# Altium footprint library 未分类IC.PcbLib: 28 footprints (part 1 of 2)
Each footprint in its own frame and in the unit in brackets; x right, y up, seen from the top. Pads: shape width x height; smd on the part's side, far side on the other; paste and mask are expansions set on the pad; w line width, h text height; cw(c..) or ccw(c..) is an arc to the next point about the centre after c.
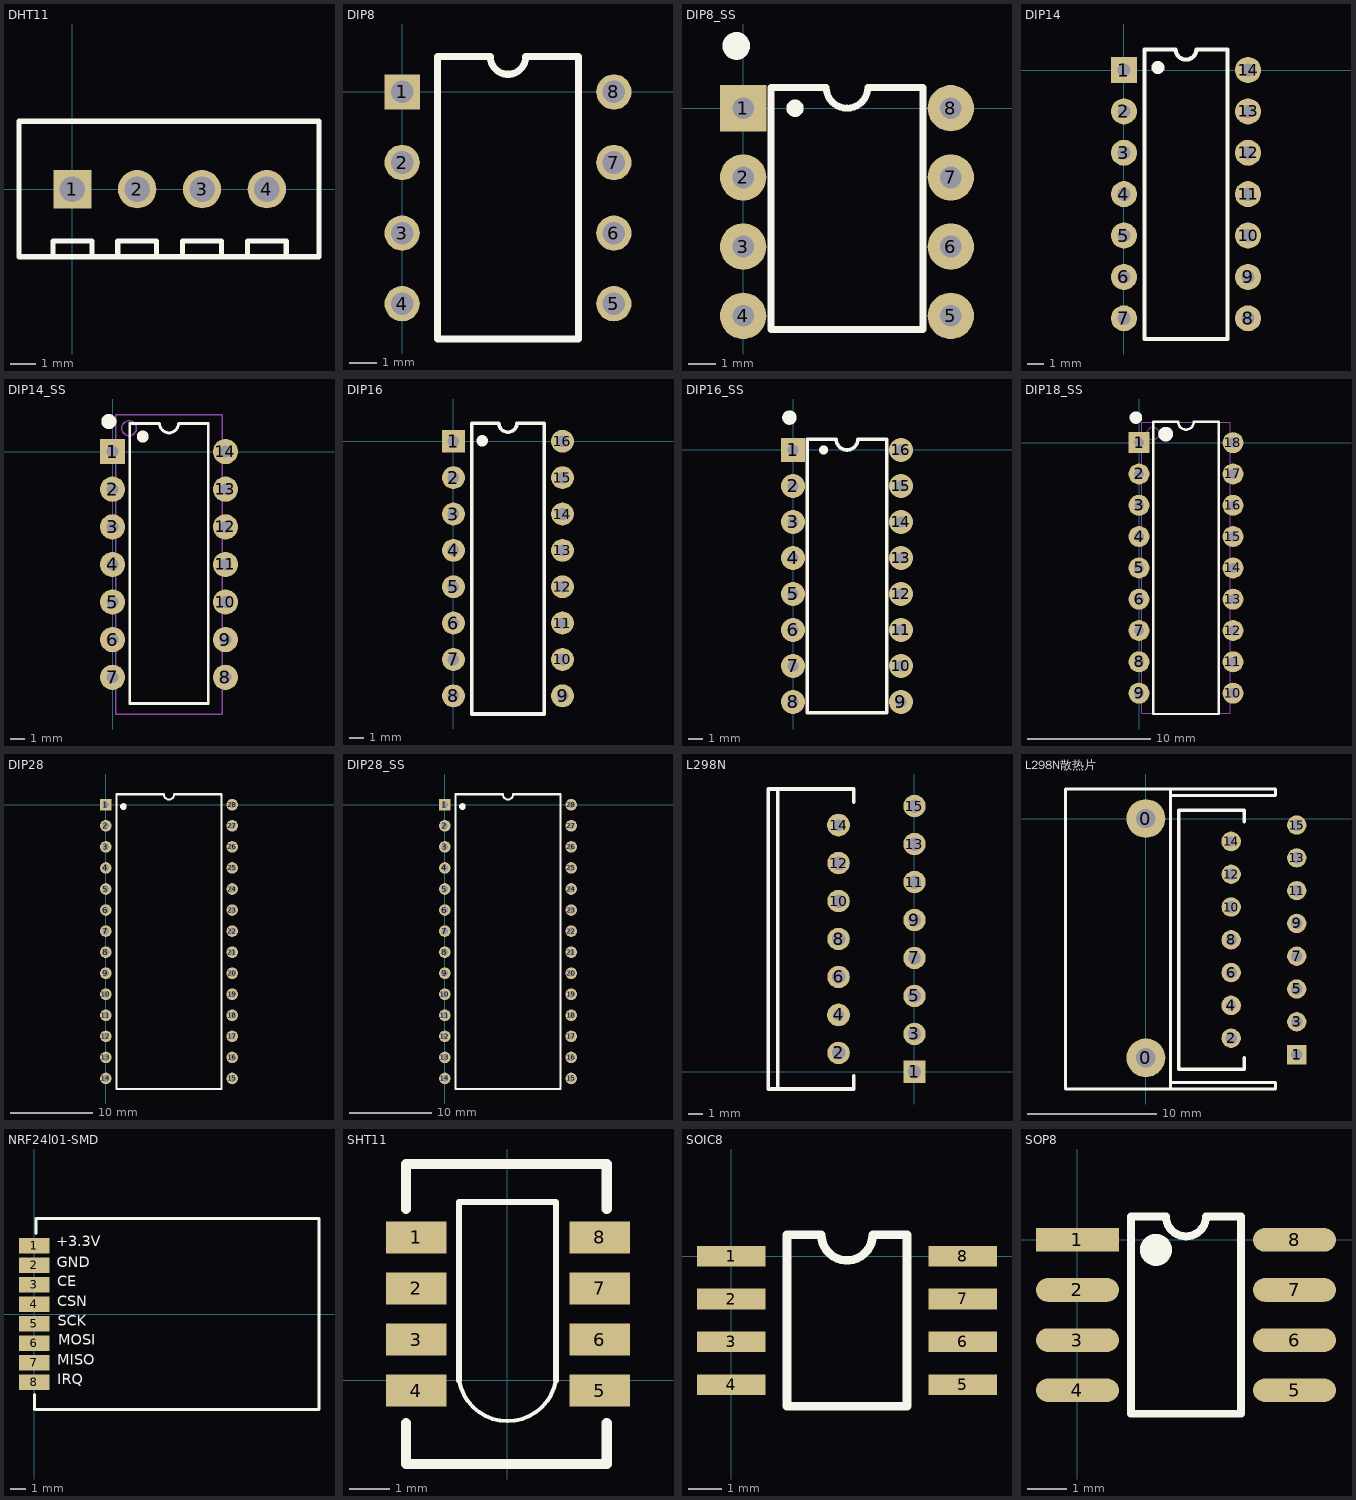
[diagram p0: the footprints below, top view; thin cyan lines are the x and y axes]

## DHT11 [mm]
pads (4):
  rect 1.5x1.5 hole 1: 1(0,0)
  round 1.5 hole 1: 2(2.54,0) 3(5.08,0) 4(7.62,0)
Top Overlay:
  lines w0.203: -0.762,-2.648 -0.762,-2.032 0.762,-2.032 0.762,-2.648 ; 1.778,-2.648 1.778,-2.032 3.302,-2.032 3.302,-2.54 ; 4.318,-2.648 4.318,-2.032 5.842,-2.032 5.842,-2.54 ; 6.858,-2.648 6.858,-2.032 8.382,-2.032 8.382,-2.54 ; -2.094,-2.648 9.666,-2.648 9.666,2.66 -2.094,2.66 -2.094,-2.648
3D body "User Library-DHT11.STEP": height 15.5, standoff -8, extent -2.221,-2.75 9.779,2.75

## DIP8 [mil]
pads (8):
  rect 50x50 hole 32: 1(0,0)
  round 50 hole 32: 2(0,-100) 3(0,-200) 4(0,-300) 5(300,-300) 6(300,-200) 7(300,-100) 8(300,0)
Top Overlay:
  lines w10: 50,-350 50,50 125,50 ccw(c150,50) 175,50 250,50 250,-350 50,-350
3D body "DIP8.STEP": height 200, standoff -137.8, extent -4.92,-359.96 304.92,69.96

## DIP8_SS [mm] "DIP8-SMD Socket"
pads (8):
  rect 1.7x1.7 hole 0.8: 1(0,0)
  round 1.7 hole 0.8: 2(0,-2.54) 3(0,-5.08) 4(0,-7.62) 5(7.62,-7.62) 6(7.62,-5.08) 7(7.62,-2.54) 8(7.62,0)
Top Overlay:
  circle w0.508: c-0.254,2.286 r0.254
  circle w0.381: c1.905,0 r0.127
  lines w0.254: 1.016,-8.128 6.604,-8.128 6.604,0.762 4.572,0.762 cw(c3.81,0.762) 3.81,0 cw(c3.81,0.762) 3.048,0.762 1.016,0.762 1.016,-8.128
3D body "DIP-MH8-300.STEP": height 4.95, standoff -2.95, extent -1.19,-9 8.81,1.38
3D body "DIP8-300.STEP": height 7.7, standoff 0, extent -0.115,-8.51 7.735,0.89

## DIP14 [mm]
pads (14):
  rect 1.6x1.6 hole 0.813: 1(0,0)
  round 1.6 hole 0.813: 2(0,-2.54) 3(0,-5.08) 4(0,-7.62) 5(0,-10.16) 6(0,-12.7) 7(0,-15.24) 8(7.62,-15.24) 9(7.62,-12.7) 10(7.62,-10.16) 11(7.62,-7.62) 12(7.62,-5.08) 13(7.62,-2.54) 14(7.62,0)
Top Overlay:
  circle w0.5: c2.085,0.155 r0.15
  lines w0.254: 1.27,-16.51 6.35,-16.51 6.35,1.27 4.445,1.27 cw(c3.81,1.27) 3.175,1.27 1.27,1.27 1.27,-16.51
3D body "DIP14.STEP": height 5.1, standoff -3.3, extent -0.25,-17.62 7.62,2.38

## DIP14_SS [mm] "DIP14-SMD Socket"
pads (14):
  rect 1.7x1.7 hole 0.8: 1(0,0)
  round 1.7 hole 0.8: 2(0,-2.54) 3(0,-5.08) 4(0,-7.62) 5(0,-10.16) 6(0,-12.7) 7(0,-15.24) 8(7.62,-15.24) 9(7.62,-12.7) 10(7.62,-10.16) 11(7.62,-7.62) 12(7.62,-5.08) 13(7.62,-2.54) 14(7.62,0)
Top Overlay:
  circle w0.6: c2.032,1.016 r0.1
  circle w0.508: c-0.254,2.032 r0.254
  lines w0.2: 1.16,-17.018 1.16,1.905 3.175,1.905 ccw(c3.81,1.905) 4.445,1.905 6.46,1.905 6.46,-17.018 1.16,-17.018
Mechanical 13:
  circle w0.1: c1.11,1.58 r0.5
  lines w0.1: 0.21,-17.72 0.21,2.48 7.41,2.48 7.41,-17.72 0.21,-17.72
3D body "DIP14-300.STEP": height 7.15, standoff -0.3, extent -0.17,-17.12 7.79,1.88
3D body "DIP-MH14-300.STEP": height 4.95, standoff -2.95, extent -1.19,-16.62 8.81,1.38

## DIP16 [mm]
pads (16):
  rect 1.6x1.6 hole 0.813: 1(0,0)
  round 1.6 hole 0.813: 2(0,-2.54) 3(0,-5.08) 4(0,-7.62) 5(0,-10.16) 6(0,-12.7) 7(0,-15.24) 8(0,-17.78) 9(7.627,-17.78) 10(7.62,-15.24) 11(7.62,-12.7) 12(7.62,-10.16) 13(7.62,-7.62) 14(7.62,-5.08) 15(7.62,-2.54) 16(7.62,0)
Top Overlay:
  circle w0.5: c2.014,0.035 r0.15
  lines w0.254: 1.27,-19.05 6.35,-19.05 6.35,1.27 4.445,1.27 cw(c3.81,1.27) 3.175,1.27 1.27,1.27 1.27,-19.05
3D body "DIP16.STEP": height 5.1, standoff -3.3, extent -0.119,-18.763 7.751,1.237

## DIP16_SS [mm] "DIP16-SMD Socket"
pads (16):
  rect 1.7x1.7 hole 0.8: 1(0,0)
  round 1.7 hole 0.8: 2(0,-2.54) 3(0,-5.08) 4(0,-7.62) 5(0,-10.16) 6(0,-12.7) 7(0,-15.24) 8(0,-17.78) 9(7.62,-17.78) 10(7.62,-15.24) 11(7.62,-12.7) 12(7.62,-10.16) 13(7.62,-7.62) 14(7.62,-5.08) 15(7.62,-2.54) 16(7.62,0)
Top Overlay:
  circle w0.381: c2.159,0 r0.127
  circle w0.508: c-0.254,2.286 r0.254
  lines w0.254: 1.016,-18.542 1.016,0.762 3.048,0.762 ccw(c3.81,0.762) 3.81,0 ccw(c3.81,0.762) 4.572,0.762 6.604,0.762 6.604,-18.542 1.016,-18.542
3D body "DIP-MH16-300.STEP": height 5.25, standoff -2.95, extent -1.171,-19.14 8.81,1.36
3D body "DIP16-300.STEP": height 7.5, standoff -0.1, extent -0.21,-18.54 7.83,0.76

## DIP18_SS [mm] "DIP18-SMD Socket"
height 5.08
pads (18):
  rect 1.7x1.7 hole 0.8: 1(0,0)
  round 1.7 hole 0.8: 2(0,-2.54) 3(0,-5.08) 4(0,-7.62) 5(0,-10.16) 6(0,-12.7) 7(0,-15.24) 8(0,-17.78) 9(0,-20.32) 10(7.62,-20.32) 11(7.62,-17.78) 12(7.62,-15.24) 13(7.62,-12.7) 14(7.62,-10.16) 15(7.62,-7.62) 16(7.62,-5.08) 17(7.62,-2.54) 18(7.62,0)
Top Overlay:
  circle w0.508: c-0.254,2.032 r0.254
  circle w0.6: c2.16,0.69 r0.3
  lines w0.2: 1.16,-22.01 1.16,1.69 3.175,1.69 ccw(c3.81,1.69) 4.445,1.69 6.46,1.69 6.46,-22.01 1.16,-22.01
Mechanical 13:
  circle w0.1: c1.11,0.74 r0.5
  lines w0.1: 0.21,-21.96 0.21,1.64 7.41,1.64 7.41,-21.96 0.21,-21.96
3D body "DIP18-300.STEP": height 7.4, standoff -0.04, extent -0.19,-21.71 7.81,1.39
3D body "DIP-MH18-300.STEP": height 5.25, standoff -2.95, extent -1.171,-21.68 8.81,1.36

## DIP28 [mm]
pads (28):
  rect 1.4x1.4 hole 0.813: 1(0,0)
  round 1.4 hole 0.813: 2(0,-2.54) 3(0,-5.08) 4(0,-7.62) 5(0,-10.16) 6(0,-12.7) 7(0,-15.24) 8(0,-17.78) 9(0,-20.32) 10(0,-22.86) 11(0,-25.4) 12(0,-27.94) 13(0,-30.48) 14(0,-33.02) 15(15.24,-33.02) 16(15.24,-30.48) 17(15.24,-27.94) 18(15.24,-25.4) 19(15.24,-22.86) 20(15.24,-20.32) 21(15.24,-17.78) 22(15.24,-15.24) 23(15.24,-12.7) 24(15.24,-10.16) 25(15.24,-7.62) 26(15.24,-5.08) 27(15.24,-2.54) 28(15.24,0)
Top Overlay:
  circle w0.5: c2.12,-0.21 r0.15
  lines w0.254: 1.27,-34.29 13.97,-34.29 13.97,1.27 8.255,1.27 cw(c7.62,1.27) 6.985,1.27 1.27,1.27 1.27,-34.29
3D body "DIP28.STEP": height 4.66, standoff -3.28, extent -0.126,-34.486 15.494,1.524

## DIP28_SS [mm] "DIP28-SMD Socket"
pads (28):
  rect 1.4x1.4 hole 0.813: 1(0,0)
  round 1.4 hole 0.813: 2(0,-2.54) 3(0,-5.08) 4(0,-7.62) 5(0,-10.16) 6(0,-12.7) 7(0,-15.24) 8(0,-17.78) 9(0,-20.32) 10(0,-22.86) 11(0,-25.4) 12(0,-27.94) 13(0,-30.48) 14(0,-33.02) 15(15.24,-33.02) 16(15.24,-30.48) 17(15.24,-27.94) 18(15.24,-25.4) 19(15.24,-22.86) 20(15.24,-20.32) 21(15.24,-17.78) 22(15.24,-15.24) 23(15.24,-12.7) 24(15.24,-10.16) 25(15.24,-7.62) 26(15.24,-5.08) 27(15.24,-2.54) 28(15.24,0)
Top Overlay:
  circle w0.5: c2.12,-0.21 r0.15
  lines w0.254: 1.27,-34.29 13.97,-34.29 13.97,1.27 8.255,1.27 cw(c7.62,1.27) 6.985,1.27 1.27,1.27 1.27,-34.29
3D body "DIP28-座.STEP": height 5.1, standoff -3.1, extent -1.27,-34.29 16.51,1.27
3D body "DIP28.STEP": height 7.66, standoff -0.28, extent -0.063,-34.613 15.557,1.397

## L298N [mm]
pads (15):
  rect 1.5x1.5 hole 0.9: 1(0,0)
  round 1.5 hole 0.9: 2(-5.08,1.27) 3(0,2.54) 5(0,5.08) 6(-5.08,6.35) 7(0,7.62) 8(-5.08,8.89) 9(0,10.16) 10(-5.08,11.43) 11(0,12.7) 12(-5.08,13.97) 13(0,15.24) 15(0,17.78)
  round 1.524 hole 0.762: 4(-5.08,3.81) 14(-5.08,16.51)
Top Overlay:
  lines w0.254: -9.017,18.923 -9.779,18.923 -9.779,-0.508 -9.779,-1.143 -9.144,-1.143 ; -4.064,-0.254 -4.064,-1.143 -6.731,-1.143 -9.144,-1.143 ; -4.064,18.034 -4.064,18.923 -6.731,18.923 -9.144,18.923 -9.144,-1.143
3D body "User Library-Multiwatt15V.STEP": height 20.8, standoff -1.5, extent -9.652,-0.889 0.238,18.711

## L298N散热片 [mm]
pads (17):
  round 3 hole 1.5: 0(0,-18.542) 0(0,0)
  rect 1.5x1.5 hole 0.9: 1(11.684,-18.288)
  round 1.5 hole 0.9: 2(6.604,-17.018) 3(11.684,-15.748) 5(11.684,-13.208) 6(6.604,-11.938) 7(11.684,-10.668) 8(6.604,-9.398) 9(11.684,-8.128) 10(6.604,-6.858) 11(11.684,-5.588) 12(6.604,-4.318) 13(11.684,-3.048) 15(11.684,-0.508)
  round 1.524 hole 0.762: 4(6.604,-14.478) 14(6.604,-1.778)
Top Overlay:
  lines w0.254: 1.905,-20.447 10.033,-20.447 10.033,-20.955 1.905,-20.955 ; 1.905,1.778 10.033,1.778 10.033,2.286 9.779,2.286 1.905,2.286 ; 7.62,-18.542 7.62,-19.431 4.953,-19.431 2.54,-19.431 2.54,0.635 4.953,0.635 7.62,0.635 7.62,-0.254 ; 1.905,-20.955 1.905,-19.812 1.905,-18.796 1.905,2.286 ; 1.905,-20.955 -6.223,-20.955 -6.223,2.286 1.905,2.286
3D body "User Library-radiator_l298.STEP": height 25, standoff -4, extent -6.602,-21.209 9.398,2.791
3D body "User Library-Multiwatt15V.STEP": height 20.8, standoff -1.5, extent 2.032,-19.177 11.922,0.423

## NRF24l01-SMD [mm]
height 0.051
pads (8):
  rect 2x1 smd: 1(0,4.445) 2(0,3.175) 3(0,1.905) 4(0,0.635) 5(0,-0.635) 6(0,-1.905) 7(0,-3.175) 8(0,-4.445)
Top Overlay:
  lines w0.2: 0,-5.255 0,-6.191 0.032,-6.223 18.542,-6.223 18.542,6.223 0.122,6.223 0.1,6.201 0.1,5.245
  text "IRQ" at 1.499,-4.826 h1.2
  text "MISO" at 1.499,-3.581 h1.2
  text "MOSI" at 1.549,-2.261 h1.2
  text "SCK" at 1.524,-1.016 h1.2
  text "CSN" at 1.499,0.254 h1.2
  text "CE" at 1.499,1.549 h1.2
  text "GND" at 1.448,2.794 h1.2
  text "+3.3V" at 1.422,4.14 h1.2
3D body: height 2, standoff 0.1, extent 3.81,-5.08 8.89,-3.175
3D body: height 1.3, standoff 0.1, extent 1.905,-5.334 3.175,-4.445
3D body: height 1.3, standoff 0.1, extent 1.905,-3.81 3.175,-2.794
3D body: height 1.3, standoff 0.1, extent 16.764,-1.651 17.78,0.381
3D body: height 1.3, standoff 0.1, extent 9.652,-3.683 10.668,-0.635
3D body: height 1.3, standoff 0.1, extent 16.764,-5.207 17.78,-3.683
3D body: height 1.3, standoff 0.1, extent 11.684,-3.683 17.78,-2.667
3D body: height 1.3, standoff 0.1, extent 11.684,-2.667 12.7,-1.651
3D body: height 1.3, standoff 0.1, extent 11.684,-1.651 17.78,-0.635
3D body: height 1.3, standoff 0.1, extent 11.684,0.381 17.78,1.397
3D body: height 1.3, standoff 0.1, extent 11.684,0.889 12.7,2.413
3D body: height 1.3, standoff 0.1, extent 11.684,2.413 17.78,3.429
3D body: height 1.3, standoff 0.1, extent 16.764,2.921 17.78,4.445
3D body: height 1.3, standoff 0.1, extent 9.652,4.445 17.78,5.461
3D body: height 1.3, standoff 0, extent 9.652,-0.635 10.668,4.953
3D body: height 1.8, standoff 0.1, extent 2.032,-0.635 8.008,5.353
3D body: height 1.2, standoff 0, extent 1.016,-5.715 18.288,5.969

## SHT11 [mm]
pads (8):
  rect 1.5x0.8 smd: 1(-2.273,3.556) 2(-2.273,2.286) 3(-2.273,1.016) 4(-2.273,-0.254) 5(2.299,-0.254) 6(2.299,1.016) 7(2.299,2.286) 8(2.299,3.556)
Top Overlay:
  lines w0.1: -1.207,0 ccw(c0,0.206) 1.207,0
  lines w0.15: -1.206,0 -1.206,4.445 1.206,4.445 1.206,0
  lines w0.254: -2.527,-1.068 -2.527,-2.084 2.473,-2.084 2.473,-1.063 ; -2.527,4.266 -2.527,5.386 2.473,5.386 2.473,4.271
3D body "SHT11.STEP": height 2.35, standoff -0.01, extent -2.452,-2.061 2.478,5.409

## SOIC8 [mil]
pads (8):
  rect 80x24 smd: 1(0,0) 2(0,-50.06) 3(0,-100.06) 4(0,-150.06) 5(270,-150) 6(270,-100) 7(270,-50) 8(270,0)
Top Overlay:
  lines w10: 75,24.94 75.06,25 105,25 ccw(c135,25) 165,25 204.94,25 205,24.94 205,-175.06 65,-175.06 65,24.94 95,24.94
3D body "SOIC-8.STEP": height 68.7, standoff -0.31, extent 12.97,-173.85 257.03,23

## SOP8 [mm]
height 1.75
pads (8):
  rect 2.1x0.6 smd: 1(0,0)
  oval 2.1x0.6 smd: 2(0,-1.27) 3(0,-2.54) 4(0,-3.81) 5(5.5,-3.81) 6(5.5,-2.54) 7(5.5,-1.27) 8(5.5,0)
Top Overlay:
  circle w0.5: c1.988,-0.254 r0.155
  lines w0.2: 1.353,0.595 1.353,-4.405 4.147,-4.405 4.147,0.595
  lines w0.203: 1.353,0.595 2.242,0.595 ccw(c2.75,0.595) 2.75,0.087 ccw(c2.75,0.595) 3.258,0.595 4.147,0.595
3D body "SOP8.STEP": height 1.9, standoff 0, extent -0.361,-4.369 5.644,0.631